# Altium footprint library USER_Lib.PcbLib: 105 footprints (part 1 of 7)
Each footprint in its own frame and in the unit in brackets; x right, y up, seen from the top. Pads: shape width x height; smd on the part's side, far side on the other; paste and mask are expansions set on the pad; w line width, h text height; cw(c..) or ccw(c..) is an arc to the next point about the centre after c.
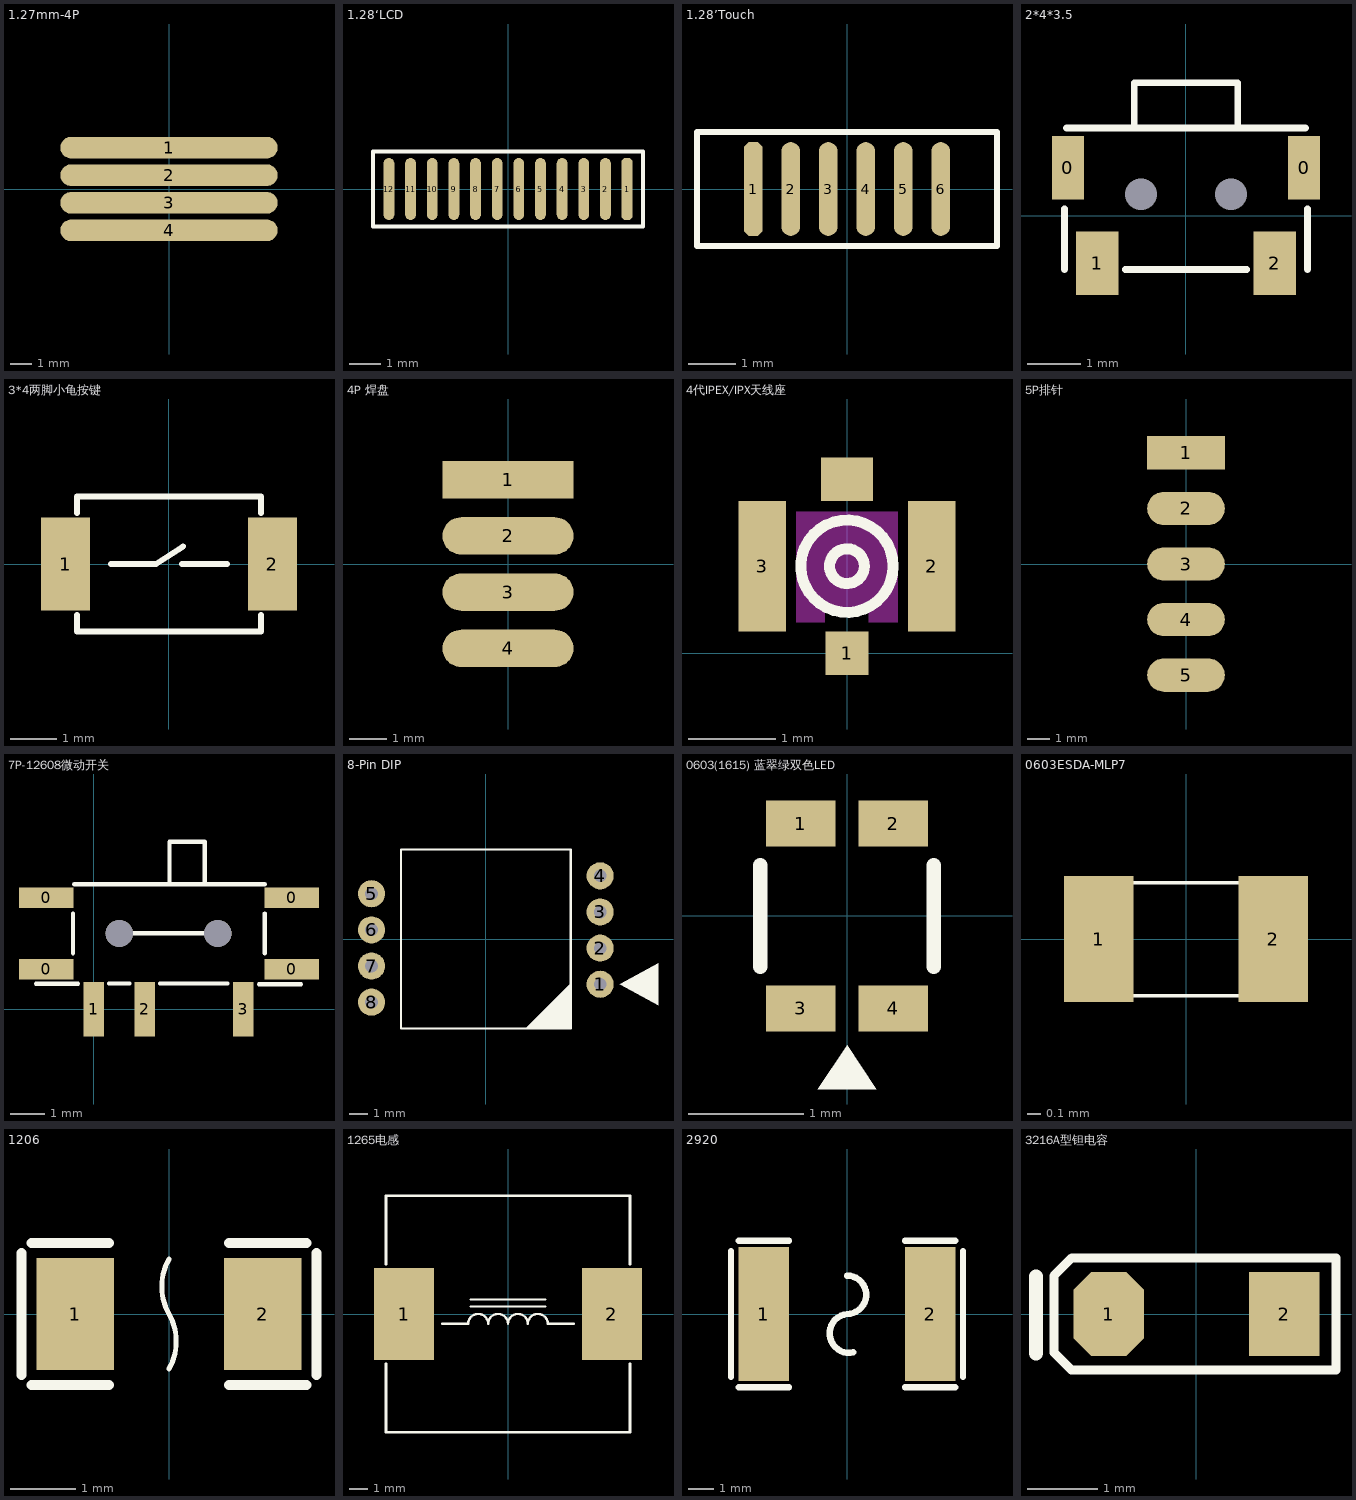
[diagram p0: the footprints below, top view; thin cyan lines are the x and y axes]

## 1.27mm-4P [mm]
pads (4):
  oval 10x1 smd mask+0.102: 1(0,1.905) 2(0,0.635) 3(0,-0.635) 4(0,-1.905)

## 1.28‘LCD [mm]
pads (12):
  oct 0.35x2 smd: 1(3.85,0)
  oval 0.35x2 smd: 2(3.15,0) 3(2.45,0) 4(1.75,0) 5(1.05,0) 6(0.35,0) 7(-0.35,0) 8(-1.05,0) 9(-1.75,0) 10(-2.45,0) 11(-3.15,0) 12(-3.85,0)
Top Overlay:
  lines w0.127: 4.36,-1.219 -4.36,-1.219 -4.36,1.219 4.36,1.219 ; 4.36,-1.219 4.36,-1.219 ; 4.36,-1.219 4.36,1.219 ; 4.36,1.219 4.36,1.219

## 1.28’Touch [mm]
pads (6):
  oct 0.4x2 smd: 1(-2,0)
  oval 0.4x2 smd: 2(-1.2,0) 3(-0.4,0) 4(0.4,0) 5(1.2,0) 6(2,0)
Top Overlay:
  lines w0.127: 3.2,-1.219 3.2,1.219 -3.2,1.219 -3.2,-1.219 3.2,-1.219 ; 3.2,-1.219 3.2,-1.219

## 2*4*3.5 [mm] "2*4*3.5按键"
pads (6):
  rect 0.6x1.2 smd mask+0.102: 0(-2.225,0.9) 0(2.225,0.9)
  round 0 hole 0.6 mask+0.102: 0(-0.85,0.4) 0(0.85,0.4)
  rect 0.8x1.2 smd mask+0.102: 1(-1.675,-0.9) 2(1.675,-0.9)
Top Overlay:
  lines w0.127: -2.286,-1.016 -2.286,0.127 ; -2.25,1.651 0,1.651 ; -1.143,-1.016 1.143,-1.016 ; -0.976,1.691 -0.976,2.5 -0.001,2.5 0.974,2.5 0.974,1.693 ; -0.001,1.651 2.249,1.651 ; 2.286,-1.016 2.286,0.127
3D body "User Library-Button_2x4mm_Side_SMT.STEP": height 1.85, standoff -0.4, extent -2.225,-1.118 2.225,2.402

## 3*4两脚小龟按键 [mm]
pads (2):
  rect 1.05x2 smd: 1(-2.225,0) 2(2.225,0)
Top Overlay:
  lines w0.127: -1.981,-1.45 -1.981,-1.092 ; -1.981,1.092 -1.981,1.45 ; -1.975,-1.448 1.975,-1.448 ; -1.975,1.448 1.975,1.448 ; -1.245,0 -0.279,0 0.305,0.381 ; 0.279,0 1.245,0 ; 1.981,-1.45 1.981,-1.092 ; 1.981,1.092 1.981,1.45
3D body "3x4两脚小龟.STEP": height 2, standoff -0.01, extent -2.5,-1.45 2.5,1.45

## 4P 焊盘 [mm]
pads (4):
  rect 3.5x1 smd: 1(0,2.25)
  oval 3.5x1 smd: 2(0,0.75) 3(0,-0.75) 4(0,-2.25)

## 4代IPEX/IPX天线座 [mm]
pads (4):
  rect 0.5x0.5 smd: 1(0,0)
  rect 0.55x1.5 smd: 2(0.975,1) 3(-0.975,1)
  rect 0.6x0.5 smd: ""(0,2)
Top Overlay:
  circle w0.127: c0,1 r0.2
  circle w0.127: c0,1 r0.531
Keep-Out Layer:
  pour cut-out: -0.584,0.356 -0.584,1.626 0.584,1.626 0.584,0.356 0.248,0.356 0.248,0.533 -0.254,0.533 -0.254,0.356

## 5P排针 [mm]
pads (5):
  rect 3.5x1.5 smd: 1(0,5)
  oval 3.5x1.5 smd: 2(0,2.5) 3(0,0) 4(0,-2.5) 5(0,-5)

## 7P-12608微动开关 [mm]
pads (9):
  rect 1.6x0.6 smd: 0(-1.403,1.179) 0(-1.403,3.279) 0(5.829,1.179) 0(5.829,3.279)
  rect 0.6x1.6 smd: 1(0,0) 2(1.5,0) 3(4.4,0)
  round 0.8 hole 0.8 unplated mask+0.102: ""(0.75,2.229) ""(3.65,2.229)
Top Overlay:
  lines w0.127: -1.7,0.752 -0.464,0.752 ; -0.613,1.647 -0.613,2.816 ; -0.579,3.679 5.032,3.679 ; 0.444,0.754 1.052,0.754 ; 0.75,2.229 3.65,2.229 ; 1.948,0.753 3.937,0.753 ; 2.226,3.679 2.226,4.929 3.267,4.929 3.267,3.684 ; 4.864,0.729 6.101,0.729 ; 5.032,1.644 5.032,2.814
3D body "开关.stp": height 1.4, standoff -0.5, extent -1.7,-0.211 6.1,4.989

## 8-Pin DIP [mm]
pads (8):
  round 1.5 hole 0.7: 1(6.325,-2.505) 2(6.325,-0.505) 3(6.325,1.495) 4(6.325,3.495) 5(-6.325,2.505) 6(-6.325,0.505) 7(-6.325,-1.495) 8(-6.325,-3.495)
Top Overlay:
  region: 2.199,-4.95 4.699,-2.45 4.699,-4.95
  region: 7.417,-2.515 9.525,-1.352 9.525,-3.677
  lines w0.127: -4.699,-4.95 4.699,-4.95 4.699,4.95 -4.699,4.95 -4.699,-4.95
3D body "鼠标光感.stp": height 3.85, standoff -2.5, extent -6.374,-4.947 6.476,4.953

## 0603(1615) 蓝翠绿双色LED [mm] "0603(1615) 蓝翠绿双色LED"
pads (4):
  rect 0.6x0.4 smd mask+0.102: 1(-0.4,0.8) 2(0.4,0.8) 3(-0.4,-0.8) 4(0.4,-0.8)
Top Overlay:
  region: 0,-1.118 0.254,-1.499 -0.254,-1.499
  lines w0.127: -0.75,-0.439 -0.75,0.438 ; 0.75,-0.439 0.75,0.438

## 0603ESDA-MLP7 [mm]
pads (2):
  rect 0.5x0.9 smd mask+0.102: 1(-0.625,0) 2(0.625,0)
Top Overlay:
  lines w0.025: -0.79,-0.406 0.81,-0.406 0.81,0.404 -0.79,0.404 -0.79,-0.406
3D body: height 0.53, standoff 0, extent -0.803,-0.419 0.823,0.417

## 1206 [mm] "自恢复保险丝"
pads (2):
  rect 1.19x1.728 smd: 1(-1.445,0) 2(1.445,0)
Top Overlay:
  lines w0.076: 0,-0.845 ccw(c-0.732,-0.422) 0,0 cw(c0.732,0.422) 0,0.845
  lines w0.152: -2.269,-0.94 -2.269,0.94 ; -2.116,-1.093 -0.926,-1.093 ; -2.116,1.093 -0.926,1.093 ; 0.926,-1.093 2.116,-1.093 ; 0.926,1.093 2.116,1.093 ; 2.269,-0.94 2.269,0.94

## 1265电感 [mm] "1265一体成型电感"
pads (2):
  rect 3.25x5 smd mask+0.102: 1(-5.625,0) 2(5.625,0)
Top Overlay:
  lines w0.127: -3.556,-0.533 -2.155,-0.533 cw(c-1.616,-0.533) -1.078,-0.533 cw(c-0.539,-0.533) 0,-0.533 cw(c0.539,-0.533) 1.078,-0.533 cw(c1.616,-0.533) 2.155,-0.533 3.556,-0.533 ; -2.032,0.406 2.032,0.406 ; -2.032,0.787 2.032,0.787
  lines w0.152: -6.604,-2.692 -6.604,-6.401 6.604,-6.401 6.604,-2.692 ; -6.604,2.692 -6.604,6.401 6.604,6.401 6.604,2.692
3D body "1265一体成型电感.STEP": height 6.5, standoff 0, extent -6.6,-6.4 6.6,6.4

## 2920 [mm] "自恢复保险丝"
pads (2):
  rect 2x5.3 smd: 1(-3.3,0) 2(3.3,0)
Top Overlay:
  lines w0.254: -4.6,-2.5 -4.6,2.5 ; -4.3,-2.9 -2.3,-2.9 ; -4.3,2.9 -2.3,2.9 ; 0,1.524 cw(c0,0.762) 0,0 ccw(c0.085,-0.769) 0.254,-1.524 ; 2.3,-2.9 4.3,-2.9 ; 2.3,2.9 4.3,2.9 ; 4.6,-2.5 4.6,2.5
3D body "2990 自恢复保险丝.STEP": height 0.6, standoff 0, extent -3.365,-2.4 3.365,2.4

## 3216A型钽电容 [mm]
pads (2):
  oct 1x1.2 smd mask+0.102: 1(-1.25,0)
  rect 1x1.2 smd mask+0.102: 2(1.25,0)
Top Overlay:
  lines w0.127: 1.6,0.8 1.599,0.8 ; 1.599,0.8 -1.776,0.8 -2.032,0.544 -2.032,-0.547 -1.778,-0.8 1.6,-0.8 1.987,-0.8 1.987,0.8 1.599,0.8
  lines w0.203: -2.286,-0.559 -2.286,0.533
3D body "1206 钽电容.STEP": height 1.6, standoff 0, extent -1.6,-0.8 1.6,0.8